# Altium footprint library cool_library.PcbLib: 1182 footprints (part 73 of 75)
Each footprint in its own frame and in the unit in brackets; x right, y up, seen from the top. Pads: shape width x height; smd on the part's side, far side on the other; paste and mask are expansions set on the pad; w line width, h text height; cw(c..) or ccw(c..) is an arc to the next point about the centre after c.
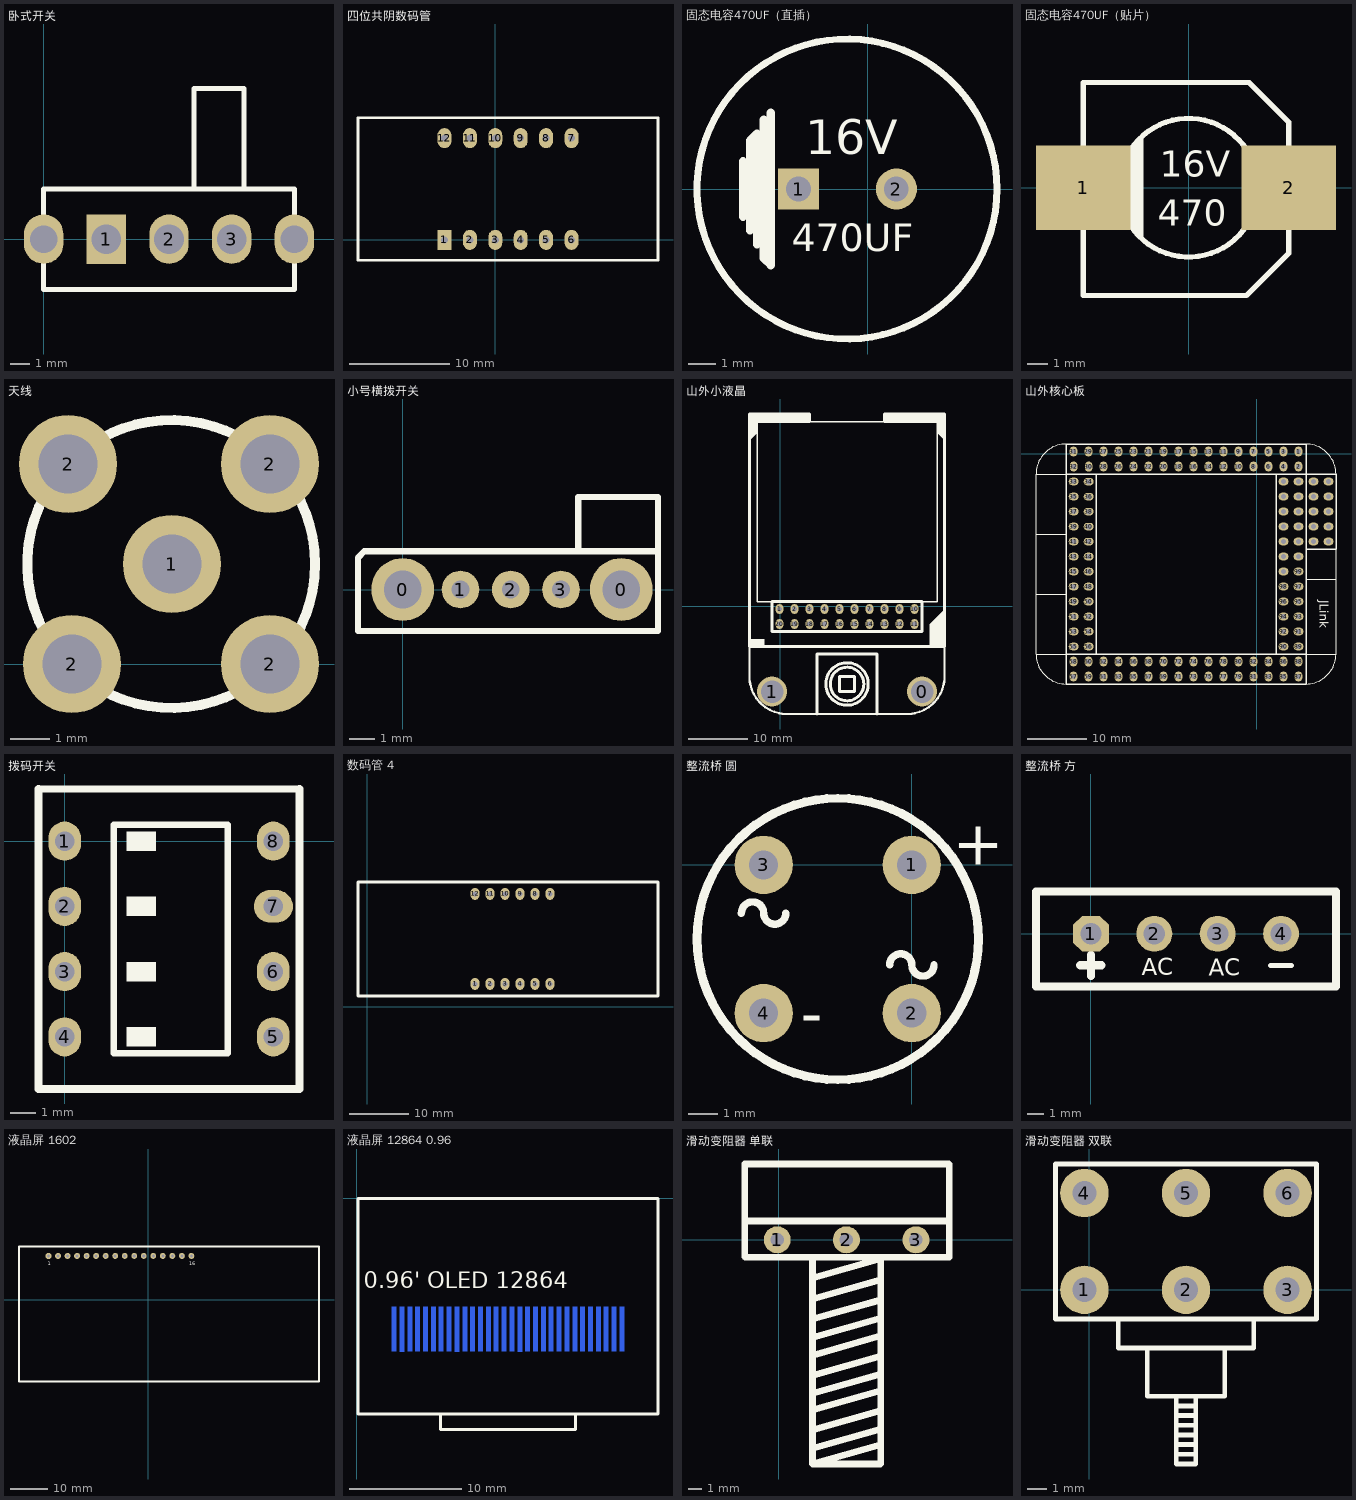
[diagram p72: the footprints below, top view; thin cyan lines are the x and y axes]

## 卧式开关 [mm]
pads (5):
  rect 2x2.5 hole 1.5: 1(3.175,0)
  oval 2x2.5 hole 1.5: 2(6.35,0) 3(9.525,0)
  oval 2x2.5 hole 1.4: ""(0,0) ""(12.7,0)
Top Overlay:
  lines w0.254: 7.62,2.54 7.62,7.62 10.16,7.62 10.16,2.54 ; 0,-2.54 12.7,-2.54 12.7,2.54 0,2.54 0,-2.54

## 四位共阴数码管 [mm] "0.36英寸"
pads (12):
  rect 1.4x2 hole 0.7: 1(-5.08,0)
  oval 1.4x2 hole 0.7: 2(-2.54,0) 3(0,0) 4(2.54,0) 5(5.08,0) 6(7.62,0) 7(7.62,10.16) 8(5.08,10.16) 9(2.54,10.16) 10(0,10.16) 11(-2.54,10.16) 12(-5.08,10.16)
Top Overlay:
  lines w0.254: -13.716,-2.032 -13.716,12.192 16.256,12.192 16.256,-2.032 -13.716,-2.032

## 固态电容470UF（直插） [mm]
pads (2):
  rect 1.5x1.5 hole 0.9: 1(-2.54,0)
  round 1.5 hole 0.9: 2(1.052,0)
Top Overlay:
  circle w0.254: c-0.762,0 r5.5
  lines w0.305: -4.572,-1.016 -4.572,1.016 ; -4.318,-1.524 -4.318,1.778 -4.064,2.032 -4.064,-2.032 ; -3.81,2.54 -3.81,-2.54 -3.556,-2.794 -3.556,2.794
  text "470UF" at -2.794,-2.286 h1.02
  text "16V" at -2.286,1.27 h1.27

## 固态电容470UF（贴片） [mil]
pads (2):
  rect 180x160 smd: 1(-200,0) 2(190,0)
Top Overlay:
  circle w10: c0,0 r131.71
  rectangle: -120,-60 -86,54
  region: -120,54 -86,54 -86,99
  region: -120,54 -119,53 -119,-45 -131,-33 -131,2
  region: -86,-60 -86,-97 -88,-99 -109,-78 -109,-71 -120,-60
  lines w10: -200,-40 -200,-205 110,-205 190,-125 190,-38 ; -200,40 -200,200 115,200 190,125 190,38
  text "16V" at -55,21 h50
  text "470" at -59,-72 h50
3D body: height 413.39, standoff 0, extent -177.17,-163.38 177.16,163.39

## 天线 [mm]
pads (5):
  round 2.5 hole 1.5: 1(5.1,2.55) 2(2.45,5.1) 2(2.55,0) 2(7.6,0) 2(7.6,5.1)
Top Overlay:
  circle w0.254: c5.08,2.55 r3.67

## 小号横拨开关 [mm]
pads (5):
  round 2.5 hole 1.5: 0(0,0) 0(8.7,0)
  round 1.5 hole 0.7: 1(2.3,0) 2(4.3,0) 3(6.3,0)
Top Overlay:
  lines w0.254: 6.985,1.524 6.985,3.683 10.16,3.683 10.16,3.048 10.16,1.524 ; 10.16,1.524 10.16,-1.397 10.16,-1.651 -1.778,-1.651 -1.778,-1.397 -1.778,1.27 -1.524,1.524 10.16,1.524

## 山外小液晶 [mm]
pads (22):
  round 5.08 hole 3.81: 0(24.003,-14.402) 1(-1.397,-14.402)
  oval 1.3x1.7 hole 0.9: 1(-0.127,-0.432) 2(2.413,-0.432) 3(4.953,-0.432) 4(7.493,-0.432) 5(10.033,-0.432) 6(12.573,-0.432) 7(15.113,-0.432) 8(17.653,-0.432) 9(20.193,-0.432) 10(22.733,-0.432) 11(22.733,-2.972) 12(20.193,-2.972) 13(17.653,-2.972) 14(15.113,-2.972) 15(12.573,-2.972) 16(10.033,-2.972) 17(7.493,-2.972) 18(4.953,-2.972) 19(2.413,-2.972) 20(-0.127,-2.972)
Top Overlay:
  circle w0.508: c11.303,-13.132 r2.84
  circle w0.508: c11.303,-13.132 r3.592
  rectangle: -5.207,31.064 4.953,32.588
  rectangle: -5.207,29.413 -3.937,31.318
  rectangle: 17.653,31.064 27.813,32.588
  rectangle: 26.543,29.413 27.813,31.064
  rectangle: 25.273,-6.782 27.813,-2.972
  rectangle: -5.207,-6.782 -2.667,-5.512
  region: -3.937,29.413 -5.207,28.143 -5.207,29.413
  region: 26.543,29.413 27.813,28.143 27.813,29.413
  region: 25.273,-2.972 27.813,-0.432 27.813,-2.972
  lines w0.254: -3.937,31.318 -3.937,0.838 26.543,0.838 26.543,31.318 ; 4.953,31.318 17.653,31.318
  lines w0.381: -5.207,-6.782 -5.207,-11.862 ccw(c1.143,-11.862) 1.143,-18.212 21.463,-18.212 ccw(c21.463,-11.862) 27.813,-11.862 27.813,-6.782
  lines w0.508: 4.953,31.318 4.953,32.588 -5.207,32.588 -5.207,-6.782 27.813,-6.782 27.813,32.588 17.653,32.588 17.653,31.318 ; 6.223,-18.212 6.223,-8.052 16.383,-8.052 16.383,-18.212 ; -1.397,-4.242 24.003,-4.242 24.003,0.838 -1.397,0.838 -1.397,-4.242 ; 10.033,-14.402 10.033,-11.862 12.573,-11.862 12.573,-14.402 10.033,-14.402

## 山外核心板 [mm]
pads (122):
  oval 1.3x1.7 hole 0.9: 1(7.061,0.381) 2(7.061,-2.159) 3(4.521,0.381) 4(4.521,-2.159) 5(1.981,0.381) 6(1.981,-2.159) 7(-0.559,0.381) 8(-0.559,-2.159) 9(-3.099,0.381) 10(-3.099,-2.159) 11(-5.639,0.381) 12(-5.639,-2.159) 13(-8.179,0.381) 14(-8.179,-2.159) 15(-10.719,0.381) 16(-10.719,-2.159) 17(-13.259,0.381) 18(-13.259,-2.159) 19(-15.799,0.381) 20(-15.799,-2.159) 21(-18.339,0.381) 22(-18.339,-2.159) 23(-20.879,0.381) 24(-20.879,-2.159) 25(-23.419,0.381) 26(-23.419,-2.159) 27(-25.959,0.381) 28(-25.959,-2.159) 29(-28.499,0.381) 30(-28.473,-2.183) 31(-31.039,0.381) 32(-31.013,-2.159) 57(-31.039,-37.719) 58(-31.039,-35.179) 59(-28.499,-37.719) 60(-28.499,-35.181) 61(-25.959,-37.719) 62(-25.959,-35.179) 63(-23.419,-37.719) 64(-23.419,-35.179) 65(-20.879,-37.719) 66(-20.879,-35.179) 67(-18.339,-37.719) 68(-18.339,-35.179) 69(-15.799,-37.719) 70(-15.799,-35.179) 71(-13.259,-37.719) 72(-13.259,-35.179) 73(-10.719,-37.719) 74(-10.719,-35.179) 75(-8.179,-37.719) 76(-8.179,-35.179) 77(-5.639,-37.719) 78(-5.639,-35.179) 79(-3.099,-37.719) 80(-3.099,-35.179) 81(-0.559,-37.719) 82(-0.559,-35.179) 83(1.981,-37.719) 84(1.981,-35.179) 85(4.521,-37.719) 86(4.521,-35.179) 87(7.061,-37.719) 88(7.061,-35.179)
  oval 1.7x1.3 hole 0.9: 33(-31.013,-4.699) 34(-28.473,-4.721) 35(-31.013,-7.239) 36(-28.473,-7.259) 37(-31.013,-9.779) 38(-28.473,-9.798) 39(-31.013,-12.319) 40(-28.473,-12.336) 41(-31.013,-14.859) 42(-28.473,-14.874) 43(-31.013,-17.399) 44(-28.473,-17.413) 45(-31.013,-19.939) 46(-28.473,-19.951) 47(-31.013,-22.479) 48(-28.473,-22.489) 49(-31.013,-25.019) 50(-28.473,-25.027) 51(-31.013,-27.559) 52(-28.473,-27.566) 53(-31.013,-30.099) 54(-28.473,-30.104) 55(-31.013,-32.639) 56(-28.473,-32.642) 89(7.061,-32.639) 90(4.521,-32.639) 91(7.061,-30.099) 92(4.521,-30.099) 93(7.061,-27.559) 94(4.521,-27.559) 95(7.061,-25.019) 96(4.521,-25.019) 97(7.061,-22.479) 98(4.521,-22.479) 99(7.061,-19.939) 100(4.521,-19.939) 101(7.061,-17.399) 102(4.521,-17.399) 103(7.061,-14.859) 104(4.521,-14.859) 105(7.061,-12.319) 106(4.521,-12.319) 107(7.061,-9.779) 108(4.521,-9.779) 109(7.061,-7.239) 110(4.521,-7.239) 111(7.061,-4.699) 112(4.521,-4.699) 113(12.141,-4.699) 114(9.601,-4.699) 115(12.141,-7.239) 116(9.601,-7.239) 117(12.141,-9.779) 118(9.601,-9.779) 119(12.141,-12.319) 120(9.601,-12.319) 121(12.141,-14.859) 122(9.601,-14.859)
Top Overlay:
  lines w0.127: -37.389,-23.749 -32.309,-23.749 ; -37.389,-13.589 -32.309,-13.589 ; -32.309,-38.989 cw(c-32.309,-33.909) -37.389,-33.909 ; -32.309,-33.909 -37.389,-33.909 ; -32.309,-3.429 -37.389,-3.429 ; -32.309,1.651 ccw(c-32.309,-3.429) -37.389,-3.429 ; 8.331,-38.989 ccw(c8.331,-33.909) 13.411,-33.909 ; 8.331,-33.909 13.411,-33.909 ; 8.331,-21.209 13.411,-21.209 ; 8.331,1.651 cw(c8.331,-3.429) 13.411,-3.429 ; 13.411,-16.129 13.411,-33.909 ; -37.389,-33.909 -37.389,-3.429
  lines w0.254: -32.309,-38.989 -32.309,1.651 -27.229,1.651 3.251,1.651 ; -32.309,-33.909 -27.229,-33.909 ; -32.309,-3.429 -27.229,-3.429 ; -32.283,-38.989 -27.229,-38.989 3.251,-38.989 8.331,-38.989 8.331,1.651 3.277,1.651 ; 8.331,-33.909 3.251,-33.909 ; 8.331,-16.129 13.411,-16.129 13.411,-3.429 8.331,-3.429 3.251,-3.429 ; -27.229,-33.909 3.251,-33.909 ; -27.229,-33.909 -27.229,-3.429 ; -27.229,-3.429 3.251,-3.429 ; 3.251,-33.909 3.251,-3.429
  text "JLink" at 10.109,-24.765 h2.54

## 拨码开关 [mil]
pads (8):
  oval 50x60 hole 30: 1(0,0) 2(0,-100) 3(0,-200) 4(0,-300) 5(320,-300) 6(320,-200) 8(320,0)
  oval 60x50 hole 30: 7(320,-100)
Top Overlay:
  rectangle: 95,-315 140,-285
  rectangle: 95,-215 140,-185
  rectangle: 95,-115 140,-85
  rectangle: 95,-15 140,15
  lines w10: -40,80 360,80 ; 75,-325 75,25 250,25 250,-325 75,-325
  lines w12: -40,80 -40,-380 360,-380 360,80

## 数码管 4 [mil]
height 220.08
pads (12):
  oval 59.06x78.74 hole 32: 1(720,151) 2(820,151) 3(920,151) 4(1020,151) 5(1120,151) 6(1220,151) 7(1220,751) 8(1120,751) 9(1020,751) 10(920,751) 11(820,751) 12(720,751)
Top Overlay:
  lines w19.68: -60,70 -41,70 -40,71 380,71 1500,71 1920,71 1939,71 1940,70 1940,830 1939,831 1920,831 1500,831 380,831 -40,831 -59,831 -60,830 -60,70
Top Solder:
  lines w19.68: -45,70 -45,830 ; 1920,70 1920,830

## 整流桥 圆 [mm]
pads (4):
  round 2 hole 1: 1(0,0) 2(0,-5.08) 3(-5.08,0) 4(-5.08,-5.08)
Top Overlay:
  circle w0.305: c-2.54,-2.54 r4.826
  lines w0.254: -5.842,-1.651 cw(c-5.461,-1.651) -5.08,-1.651 ccw(c-4.699,-1.651) -4.318,-1.651 ; -0.762,-3.429 cw(c-0.381,-3.429) 0,-3.429 ccw(c0.381,-3.429) 0.762,-3.429
  text "-" at -3.81,-5.842 h1.52
  text "+" at 1.397,0 h1.52

## 整流桥 方 [mil]
pads (4):
  oct 85x85 hole 50: 1(0,0)
  round 85 hole 50: 2(150,0) 3(300,0) 4(450,0)
Top Overlay:
  lines w12: 425,-75 475,-75
  lines w19.68: -25,-75 25,-75 ; 0,-100 0,-50 ; -130,-125 580,-125 580,100 -130,100 -130,-125
  text "AC" at 278.74,-100 h40
  text "AC" at 120.08,-98.82 h40

## 液晶屏 1602 [mil]
height 393.7
pads (16):
  oct 62x62 hole 32: 1(-1047.48,460.79)
  round 62 hole 32: 2(-947.48,460.79) 3(-847.48,460.79) 4(-747.48,460.79) 5(-647.48,460.79) 6(-547.48,460.79) 7(-447.48,460.79) 8(-347.48,460.79) 9(-247.48,460.79) 10(-147.48,460.79) 11(-47.48,460.79) 12(52.52,460.79) 13(152.52,460.79) 14(252.52,460.79) 15(352.52,460.79) 16(452.52,460.79)
Top Overlay:
  lines w19.68: -1357.48,-859.21 -1357.48,560.79 1792.52,560.79 1792.52,-859.21 -1357.48,-859.21
  text "16" at 432.52,360.79 h40
  text "1" at -1057.48,360.79 h40

## 液晶屏 12864 0.96 [mm]
pads (30):
  rect 0.4x4 smd far side: 1(3.315,-11.633) 2(4.015,-11.633) 3(4.715,-11.633) 4(5.415,-11.633) 5(6.115,-11.633) 6(6.815,-11.633) 7(7.515,-11.633) 8(8.215,-11.633) 9(8.915,-11.633) 10(9.615,-11.633) 11(10.315,-11.633) 12(11.015,-11.633) 13(11.715,-11.633) 14(12.415,-11.633) 15(13.115,-11.633) 16(13.815,-11.633) 17(14.515,-11.633) 18(15.215,-11.633) 19(15.915,-11.633) 20(16.615,-11.633) 21(17.315,-11.633) 22(18.015,-11.633) 23(18.715,-11.633) 24(19.415,-11.633) 25(20.115,-11.633) 26(20.815,-11.633) 27(21.515,-11.633) 28(22.215,-11.633) 29(22.915,-11.633) 30(23.615,-11.633)
Top Overlay:
  lines w0.254: 7.465,-19.193 7.465,-20.573 19.465,-20.573 19.465,-19.193 ; 0.105,-19.193 0.105,-0.013 26.825,-0.013 26.825,-19.193 0.105,-19.193
  text "0.96' OLED 12864" at 0.625,-8.473 h2.5
Bottom Overlay:
  lines w0.254: 2.985,-11.953 2.465,-11.953 2.465,-16.153 7.465,-18.953 ccw(c7.465,-18.993) 7.425,-18.993 7.425,-20.573 ; 7.465,-20.573 19.425,-20.573 19.425,-18.975 24.465,-16.153 24.465,-11.953 23.945,-11.953

## 滑动变阻器 单联 [mm]
pads (3):
  round 2 hole 1: 1(-0.127,0) 2(5,0) 3(10.16,0)
Top Overlay:
  lines w0.5: -2.47,1.4 12.51,1.4 ; 2.53,-15.46 7.507,-14.048 ; 2.53,-11.39 7.507,-9.978 ; 2.535,-16.617 7.53,-15.2 ; 2.535,-12.617 7.53,-11.2 ; 2.535,-8.547 7.53,-7.13 ; 2.546,-14.106 7.512,-12.697 ; 2.546,-10.036 7.512,-8.627 ; 2.55,-7.23 7.527,-5.818 ; 2.555,-4.387 7.55,-2.97 ; 2.563,-2.804 7.52,-1.397 ; 2.566,-5.876 7.532,-4.467 ; 7.52,-16.63 2.51,-16.63 2.49,-16.61 2.49,-1.32 2.52,-1.29 7.55,-1.29 7.55,-16.6 ; 12.59,5.62 -2.54,5.62 -2.54,-1.26 -2.51,-1.29 12.61,-1.29 ; 12.63,-1.28 12.63,5.61

## 滑动变阻器 双联 [mil]
pads (6):
  round 100 hole 50: 1(-10,0) 2(200,0) 3(410,0) 4(-10,200) 5(200,200) 6(410,200)
Top Overlay:
  lines w10: 60,-60 60,-120 340,-120 340,-60 ; 120,-120 120,-220 280,-220 280,-120 ; 180,-340 220,-340 ; 180,-320 220,-320 ; 180,-300 220,-300 ; 180,-280 220,-280 ; 180,-260 220,-260 ; 180,-240 220,-240 ; 180,-220 180,-360 220,-360 220,-220 ; -70,-60 -70,260 470,260 470,-60 -70,-60